# Altium footprint library IC.PcbLib: 108 footprints (part 5 of 8)
Each footprint in its own frame and in the unit in brackets; x right, y up, seen from the top. Pads: shape width x height; smd on the part's side, far side on the other; paste and mask are expansions set on the pad; w line width, h text height; cw(c..) or ccw(c..) is an arc to the next point about the centre after c.
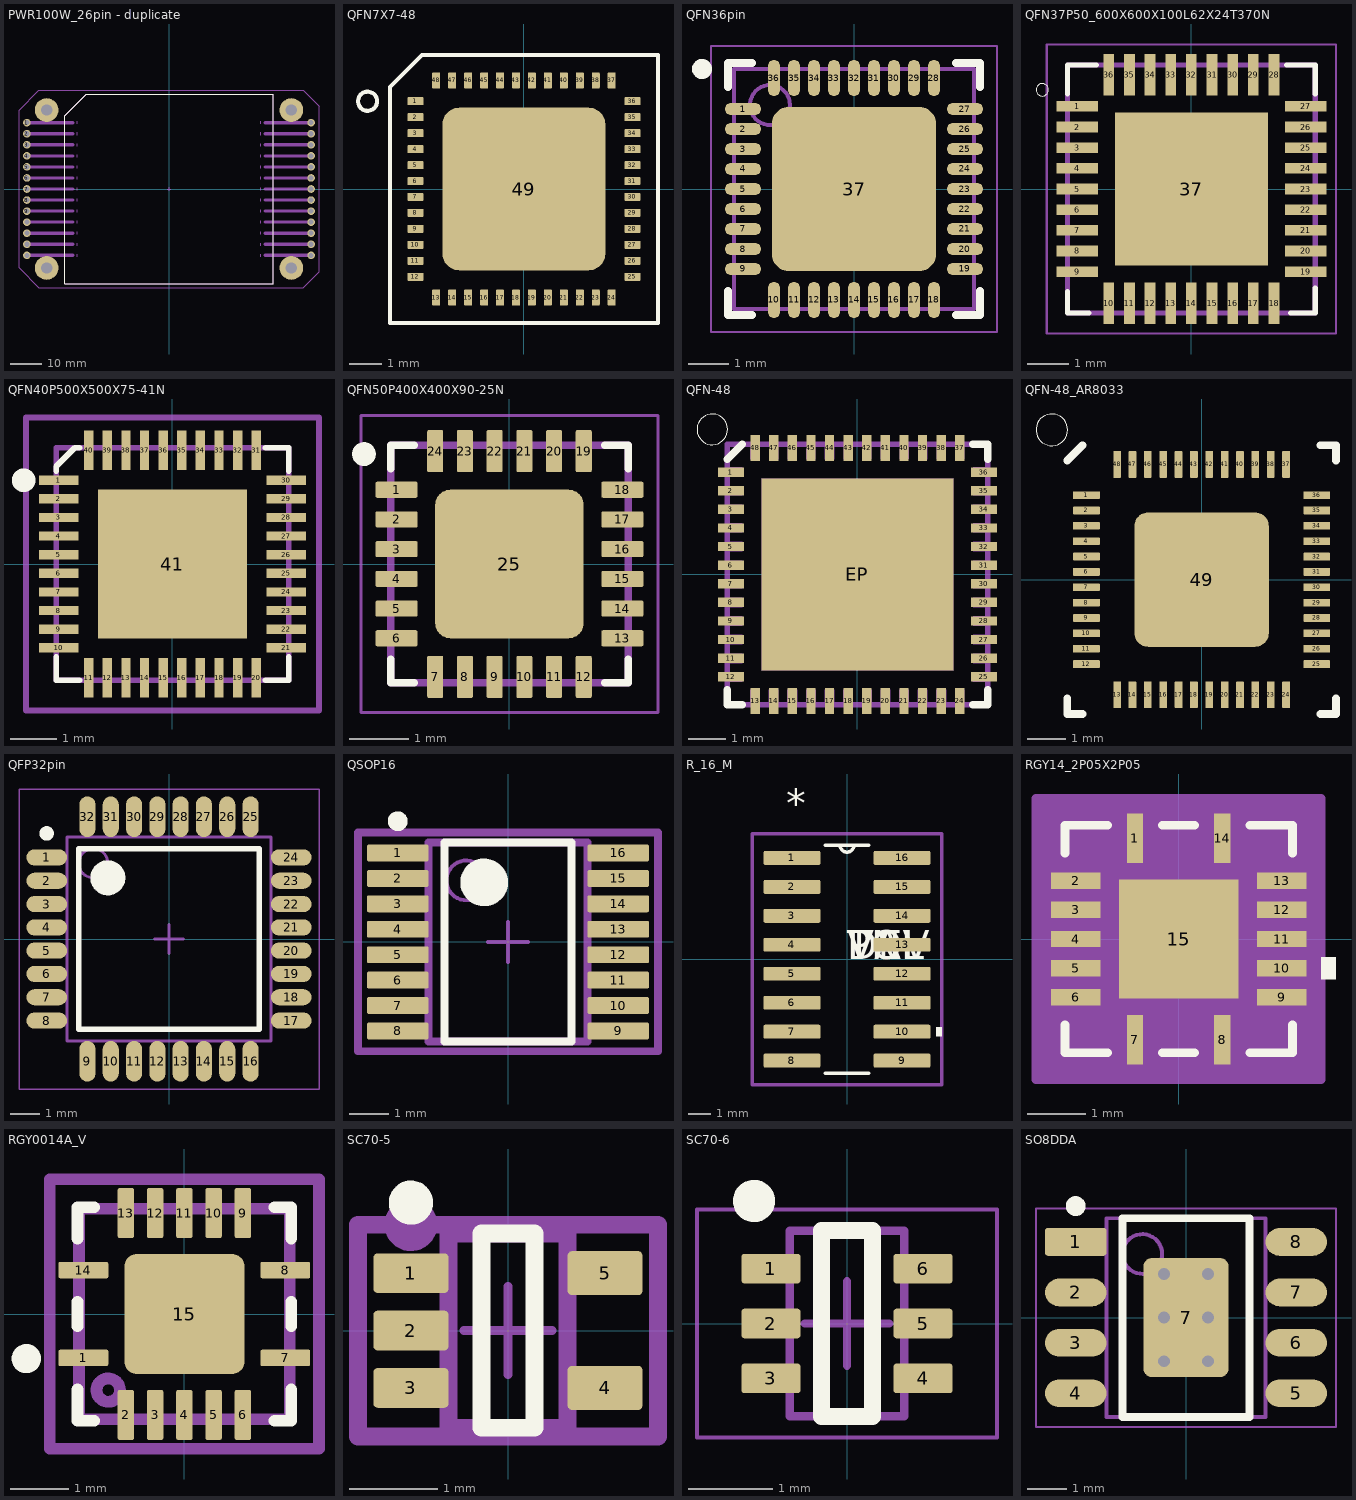
[diagram p4: the footprints below, top view; thin cyan lines are the x and y axes]

## PWR100W_26pin - duplicate [mm] "Modul CPU 26 PIN"
height 12.5
pads (30):
  round 2.4 hole 1.6: 1(-45,21.001) 2(-45,17.5) 3(-45,14.001) 4(-45,10.5) 5(-45,7.001) 6(-45,3.501) 7(-45,0) 8(-45,-3.499) 9(-45,-6.999) 10(-45,-10.5) 11(-45,-13.999) 12(-45,-17.499) 13(-45,-20.999) 14(45,-20.999) 15(45,-17.499) 16(45,-13.999) 17(45,-10.5) 18(45,-6.999) 19(45,-3.499) 20(45,0) 21(45,3.501) 22(45,7.001) 23(45,10.5) 24(45,14.001) 25(45,17.5) 26(45,21.001)
  round 7.5 hole 3.6: ""(-38.75,-25) ""(-38.75,25) ""(38.75,-25) ""(38.75,25)
Top Overlay:
  lines w0.2: -33,-30 -33,23.25 -26.25,30 33,30 33,-30 -33,-30
M3_comm_top:
  text ".comment" at -3,-0.5 h2
M5_asm_top:
  lines w0.2: -33,-30 -33,23.25 -26.25,30 33,30 33,-30 -33,-30
  lines w1: -45,-21 -30.5,-21 ; -45,-17.5 -30.5,-17.5 ; -45,-14 -30.5,-14 ; -45,-10.5 -30.5,-10.5 ; -45,-7 -30.5,-7 ; -45,-3.5 -30.5,-3.5 ; -45,-0.001 -30.5,-0.001 ; -45,3.5 -30.5,3.5 ; -45,7 -30.5,7 ; -45,10.5 -30.5,10.5 ; -45,14 -30.5,14 ; -45,17.5 -30.5,17.5 ; -45,21 -30.5,21 ; 30.5,-21 45,-21 ; 30.5,-17.5 45,-17.5 ; 30.5,-14 45,-14 ; 30.5,-10.5 45,-10.5 ; 30.5,-7 45,-7 ; 30.5,-3.5 45,-3.5 ; 30.5,-0.001 45,-0.001 ; 30.5,3.5 45,3.5 ; 30.5,7 45,7 ; 30.5,10.5 45,10.5 ; 30.5,14 45,14 ; 30.5,17.5 45,17.5 ; 30.5,21 45,21
  text "PIN #26" at 42.4,22.3 h2
  text "PIN #14" at 42.6,-23.6 h2
  text "PIN #13" at -47.4,-24 h2
  text "PIN #1" at -46.9,22.5 h2
  text ".Designator" at -2,5.5 h2
M7_courtyard_top:
  lines w0.1: -0.5,0 0.5,0 ; 0,-0.5 0,0.5
  lines w0.2: -47.5,-25 -47.5,25 -41.25,31.25 42.5,31.25 47.5,26.25 47.5,-26.25 42.5,-31.25 -41.25,-31.25 -47.5,-25
M9_board_outline:
  lines w0.2: -29,-21.406 -29,-20.606 ; -29,-17.906 -29,-17.106 ; -29,-14.406 -29,-13.606 ; -29,-10.906 -29,-10.106 ; -29,-7.406 -29,-6.606 ; -29,-3.906 -29,-3.106 ; -29,-0.406 -29,0.394 ; -29,3.094 -29,3.894 ; -29,6.594 -29,7.394 ; -29,10.094 -29,10.894 ; -29,13.594 -29,14.394 ; -29,17.094 -29,17.894 ; -29,20.594 -29,21.394 ; 29,-21.406 29,-20.606 ; 29,-17.906 29,-17.106 ; 29,-14.406 29,-13.606 ; 29,-10.906 29,-10.106 ; 29,-7.406 29,-6.606 ; 29,-3.906 29,-3.106 ; 29,-0.406 29,0.394 ; 29,3.094 29,3.894 ; 29,6.594 29,7.394 ; 29,10.094 29,10.894 ; 29,13.594 29,14.394 ; 29,17.094 29,17.894 ; 29,20.594 29,21.394
3D body "ИВЕП100В_СТЕП_формованные_вывода.STEP": height 13, standoff -2.39, extent -104.772,-106.5 -13.628,-46.5
3D body: height 6, standoff -2, extent 44.5,17.001 45.496,17.999
3D body: height 6.5, standoff 5.5, extent 44.509,17.002 45.5,17.998
3D body: height 6.5, standoff 5.5, extent 33,17.002 45,18
3D body: height 6.5, standoff 5.5, extent 33,10.002 45,11
3D body: height 6.5, standoff 5.5, extent 44.509,10.002 45.5,10.998
3D body: height 6, standoff -2, extent 44.5,10.001 45.496,10.999
3D body: height 6.5, standoff 5.5, extent 33,6.503 45,7.501
3D body: height 6.5, standoff 5.5, extent 44.508,6.503 45.5,7.499
3D body: height 6, standoff -2, extent 44.5,6.502 45.496,7.5
3D body: height 6.5, standoff 5.5, extent 33,-0.498 45,0.5
3D body: height 6.5, standoff 5.5, extent 44.508,-0.498 45.5,0.498
3D body: height 6, standoff -2, extent 44.5,-0.499 45.496,0.499
3D body: height 6.5, standoff 5.5, extent 33,-7.497 45,-6.499
3D body: height 6.5, standoff 5.5, extent 44.509,-7.497 45.5,-6.501
3D body: height 6, standoff -2, extent 44.5,-7.498 45.496,-6.5
3D body: height 6.5, standoff 5.5, extent 33,-10.998 45,-10
3D body: height 6.5, standoff 5.5, extent 44.509,-10.998 45.5,-10.002
3D body: height 6, standoff -2, extent 44.5,-10.999 45.496,-10.001
3D body: height 6, standoff -2, extent 44.5,-21.498 45.496,-20.5
3D body: height 6.5, standoff 5.5, extent 44.508,-21.497 45.5,-20.501
3D body: height 6.5, standoff 5.5, extent 33,-21.497 45,-20.499
3D body: height 6, standoff -2, extent 44.5,-17.998 45.496,-17
3D body: height 6.5, standoff 5.5, extent 44.508,-17.997 45.5,-17.001
3D body: height 6.5, standoff 5.5, extent 33,-17.997 45,-16.999
3D body: height 6.5, standoff 5.5, extent 33,-14.497 45,-13.499
3D body: height 6.5, standoff 5.5, extent 44.508,-14.497 45.5,-13.501
3D body: height 6, standoff -2, extent 44.5,-14.498 45.496,-13.5
3D body: height 6.5, standoff 5.5, extent 33,-3.997 45,-2.999
3D body: height 6.5, standoff 5.5, extent 44.508,-3.997 45.5,-3.001
3D body: height 6, standoff -2, extent 44.5,-3.998 45.496,-3
3D body: height 6.5, standoff 5.5, extent 33,3.003 45,4.001
3D body: height 6.5, standoff 5.5, extent 44.508,3.003 45.5,3.999
3D body: height 6, standoff -2, extent 44.5,3.002 45.496,4
3D body: height 6.5, standoff 5.5, extent 33,13.503 45,14.501
3D body: height 6.5, standoff 5.5, extent 44.508,13.503 45.5,14.499
3D body: height 6, standoff -2, extent 44.5,13.502 45.496,14.5
3D body: height 6.5, standoff 5.5, extent 33,20.503 45,21.501
3D body: height 6.5, standoff 5.5, extent 44.508,20.503 45.5,21.499
3D body: height 6, standoff -2, extent 44.5,20.502 45.496,21.5
3D body: height 6, standoff -2, extent -45.496,20.502 -44.5,21.5
3D body: height 6.5, standoff 5.5, extent -45.5,20.503 -44.508,21.499
3D body: height 6.5, standoff 5.5, extent -45,20.503 -33,21.501
3D body: height 6, standoff -2, extent -45.496,13.502 -44.5,14.5
3D body: height 6.5, standoff 5.5, extent -45.5,13.503 -44.508,14.499
3D body: height 6.5, standoff 5.5, extent -45,13.503 -33,14.501
3D body: height 6, standoff -2, extent -45.496,3.002 -44.5,4
3D body: height 6.5, standoff 5.5, extent -45.5,3.003 -44.508,3.999
3D body: height 6.5, standoff 5.5, extent -45,3.003 -33,4.001
3D body: height 6, standoff -2, extent -45.496,-3.998 -44.5,-3
3D body: height 6.5, standoff 5.5, extent -45.5,-3.997 -44.508,-3.001
3D body: height 6.5, standoff 5.5, extent -45,-3.997 -33,-2.999
3D body: height 6, standoff -2, extent -45.496,-14.498 -44.5,-13.5
3D body: height 6.5, standoff 5.5, extent -45.5,-14.497 -44.508,-13.501
3D body: height 6.5, standoff 5.5, extent -45,-14.497 -33,-13.499
3D body: height 6.5, standoff 5.5, extent -45,-17.997 -33,-16.999
3D body: height 6.5, standoff 5.5, extent -45.5,-17.997 -44.508,-17.001
3D body: height 6, standoff -2, extent -45.496,-17.998 -44.5,-17
3D body: height 6.5, standoff 5.5, extent -45,-21.497 -33,-20.499
3D body: height 6.5, standoff 5.5, extent -45.5,-21.497 -44.508,-20.501
3D body: height 6, standoff -2, extent -45.496,-21.498 -44.5,-20.5
3D body: height 6, standoff -2, extent -45.496,-10.999 -44.5,-10.001
3D body: height 6.5, standoff 5.5, extent -45.5,-10.998 -44.509,-10.002
3D body: height 6.5, standoff 5.5, extent -45,-10.998 -33,-10
3D body: height 6, standoff -2, extent -45.496,-7.498 -44.5,-6.5
3D body: height 6.5, standoff 5.5, extent -45.5,-7.497 -44.509,-6.501
3D body: height 6.5, standoff 5.5, extent -45,-7.497 -33,-6.499
3D body: height 6, standoff -2, extent -45.496,-0.499 -44.5,0.499
3D body: height 6.5, standoff 5.5, extent -45.5,-0.498 -44.508,0.498
3D body: height 6.5, standoff 5.5, extent -45,-0.498 -33,0.5
3D body: height 6, standoff -2, extent -45.496,6.502 -44.5,7.5
3D body: height 6.5, standoff 5.5, extent -45.5,6.503 -44.508,7.499
3D body: height 6.5, standoff 5.5, extent -45,6.503 -33,7.501
3D body: height 6, standoff -2, extent -45.496,10.001 -44.5,10.999
3D body: height 6.5, standoff 5.5, extent -45.5,10.002 -44.509,10.998
3D body: height 6.5, standoff 5.5, extent -45,10.002 -33,11
3D body: height 6.5, standoff 5.5, extent -45,17.002 -33,18
3D body: height 6.5, standoff 5.5, extent -45.5,17.002 -44.509,17.998
3D body: height 6, standoff -2, extent -45.496,17.001 -44.5,17.999
3D body "Корпус.stp": height 10, standoff 0, extent -42.5,-30 42.5,30
3D body "M3x0_5xL Phillips Panhead Screw.step": height 3.58, standoff -2.8, extent -41.55,22.2 -35.95,27.8
3D body "M3x0_5xL Phillips Panhead Screw.step": height 3.58, standoff -2.8, extent 35.95,22.2 41.55,27.8
3D body "M3x0_5xL Phillips Panhead Screw.step": height 3.58, standoff -2.8, extent 35.95,-27.8 41.55,-22.2
3D body "M3x0_5xL Phillips Panhead Screw.step": height 3.58, standoff -2.8, extent -41.55,-27.8 -35.95,-22.2

## QFN7X7-48 [mm] "KSZ9031RNX"
pads (49):
  rrect20% 0.5x0.25 smd: 1(-3.4,2.75) 2(-3.4,2.25) 3(-3.4,1.75) 4(-3.4,1.25) 5(-3.4,0.75) 6(-3.4,0.25) 7(-3.4,-0.25) 8(-3.4,-0.75) 9(-3.4,-1.25) 10(-3.4,-1.75) 11(-3.4,-2.25) 12(-3.4,-2.75) 25(3.4,-2.75) 26(3.4,-2.25) 27(3.4,-1.75) 28(3.4,-1.25) 29(3.4,-0.75) 30(3.4,-0.25) 31(3.4,0.25) 32(3.4,0.75) 33(3.4,1.25) 34(3.4,1.75) 35(3.4,2.25) 36(3.4,2.75)
  rrect20% 0.25x0.5 smd: 13(-2.75,-3.4) 14(-2.25,-3.4) 15(-1.75,-3.4) 16(-1.25,-3.4) 17(-0.75,-3.4) 18(-0.25,-3.4) 19(0.25,-3.4) 20(0.75,-3.4) 21(1.25,-3.4) 22(1.75,-3.4) 23(2.25,-3.4) 24(2.75,-3.4) 37(2.75,3.4) 38(2.25,3.4) 39(1.75,3.4) 40(1.25,3.4) 41(0.75,3.4) 42(0.25,3.4) 43(-0.25,3.4) 44(-0.75,3.4) 45(-1.25,3.4) 46(-1.75,3.4) 47(-2.25,3.4) 48(-2.75,3.4)
  rrect20% 5.1x5.1 smd: 49(0,0)
Top Overlay:
  circle w0.127: c-4.9,2.75 r0.3
  lines w0.127: -4.2,-4.2 -4.2,3.2 -3.2,4.2 4.2,4.2 4.2,-4.2 -4.2,-4.2
Top Paste:
  lines w0.025: -2.475,-1.025 -1.025,-1.025 -1.025,-2.475 ; -2.475,1.025 -1.025,1.025 -1.025,2.475 ; 1.025,-2.475 1.025,-1.025 2.475,-1.025 ; 1.025,2.475 1.025,1.025 2.475,1.025 ; -2.475,-0.725 -1.025,-0.725 -1.025,0.725 -2.475,0.725 -2.475,-0.725 ; -0.725,-2.475 0.725,-2.475 0.725,-1.025 -0.725,-1.025 -0.725,-2.475 ; -0.725,-0.725 0.725,-0.725 0.725,0.725 -0.725,0.725 -0.725,-0.725 ; -0.725,1.025 0.725,1.025 0.725,2.475 -0.725,2.475 -0.725,1.025 ; 1.025,-0.725 2.475,-0.725 2.475,0.725 1.025,0.725 1.025,-0.725

## QFN36pin [mm] "QFN, 36-Leads, IPC Medium Density"
height 1
pads (37):
  oval 0.9x0.3 smd: 1(-2.775,2) 2(-2.775,1.5) 3(-2.775,1) 4(-2.775,0.5) 5(-2.775,0) 6(-2.775,-0.5) 7(-2.775,-1) 8(-2.775,-1.5) 9(-2.775,-2) 19(2.775,-2) 20(2.775,-1.5) 21(2.775,-1) 22(2.775,-0.5) 23(2.775,0) 24(2.775,0.5) 25(2.775,1) 26(2.775,1.5) 27(2.775,2)
  oval 0.3x0.9 smd: 10(-2,-2.775) 11(-1.5,-2.775) 12(-1,-2.775) 13(-0.5,-2.775) 14(0,-2.775) 15(0.5,-2.775) 16(1,-2.775) 17(1.5,-2.775) 18(2,-2.775) 28(2,2.775) 29(1.5,2.775) 30(1,2.775) 31(0.5,2.775) 32(0,2.775) 33(-0.5,2.775) 34(-1,2.775) 35(-1.5,2.775) 36(-2,2.775)
  rrect20% 4.1x4.1 smd: 37(0,0)
Top Overlay:
  circle w0.25: c-3.8,3 r0.125
  lines w0.2: -3.15,-2.55 -3.15,-3.15 -2.55,-3.15 ; -3.15,2.55 -3.15,3.15 -2.55,3.15 ; 2.55,-3.15 3.15,-3.15 3.15,-2.55 ; 2.55,3.15 3.15,3.15 3.15,2.55
Mechanical 13:
  circle w0.1: c-2.1,2.1 r0.5
  lines w0.1: -3,-3 3,-3 3,3 -3,3 -3,-3
Mechanical 15:
  lines w0.05: -3.575,-3.575 3.575,-3.575 3.575,3.575 -3.575,3.575 -3.575,-3.575
  lines w0.1: -0.5,0 0.5,0 ; 0,-0.5 0,0.5
3D body "QFN36 (6x6).step": height 0.9, standoff 0.01, extent -3.103,-3.102 3.102,3.103

## QFN37P50_600X600X100L62X24T370N [mm]
pads (37):
  rect 1x0.26 smd: 1(-2.765,2) 2(-2.765,1.5) 3(-2.765,1) 4(-2.765,0.5) 5(-2.765,0) 6(-2.765,-0.5) 7(-2.765,-1) 8(-2.765,-1.5) 9(-2.765,-2) 19(2.765,-2) 20(2.765,-1.5) 21(2.765,-1) 22(2.765,-0.5) 23(2.765,0) 24(2.765,0.5) 25(2.765,1) 26(2.765,1.5) 27(2.765,2)
  rect 0.26x1 smd: 10(-2,-2.765) 11(-1.5,-2.765) 12(-1,-2.765) 13(-0.5,-2.765) 14(0,-2.765) 15(0.5,-2.765) 16(1,-2.765) 17(1.5,-2.765) 18(2,-2.765) 28(2,2.765) 29(1.5,2.765) 30(1,2.765) 31(0.5,2.765) 32(0,2.765) 33(-0.5,2.765) 34(-1,2.765) 35(-1.5,2.765) 36(-2,2.765)
  rect 3.7x3.7 smd: 37(0,0)
Top Overlay:
  circle w0: c-3.61,2.4 r0.15
  lines w0.127: -3,-2.48 -3,-3 -2.48,-3 ; -3,2.3 -3,3 -2.3,3 ; 2.3,3 3,3 3,2.3 ; 2.4,-3 3,-3 3,-2.4
Top Paste:
  region: 0.18,1.49 1.49,1.49 1.49,0.18 0.18,0.18
  region: -0.18,-1.496 -1.496,-1.496 -1.496,-0.18 -0.18,-0.18
  region: 1.494,-0.184 1.494,-1.493 0.177,-1.493 0.177,-0.184
  region: -1.492,0.178 -1.492,1.492 -0.182,1.492 -0.182,0.178
M1_3D_TOP:
  lines w0.05: -3.5,-3.5 3.5,-3.5 3.5,3.5 -3.5,3.5 -3.5,-3.5
  lines w0.127: -3,-3 3,-3 3,3 -3,3 -3,-3

## QFN40P500X500X75-41N [mm]
pads (41):
  rect 0.85x0.2 smd: 1(-2.45,1.8) 2(-2.45,1.4) 3(-2.45,1) 4(-2.45,0.6) 5(-2.45,0.2) 6(-2.45,-0.2) 7(-2.45,-0.6) 8(-2.45,-1) 9(-2.45,-1.4) 10(-2.45,-1.8) 21(2.45,-1.8) 22(2.45,-1.4) 23(2.45,-1) 24(2.45,-0.6) 25(2.45,-0.2) 26(2.45,0.2) 27(2.45,0.6) 28(2.45,1) 29(2.45,1.4) 30(2.45,1.8)
  rect 0.2x0.85 smd: 11(-1.8,-2.45) 12(-1.4,-2.45) 13(-1,-2.45) 14(-0.6,-2.45) 15(-0.2,-2.45) 16(0.2,-2.45) 17(0.6,-2.45) 18(1,-2.45) 19(1.4,-2.45) 20(1.8,-2.45) 31(1.8,2.45) 32(1.4,2.45) 33(1,2.45) 34(0.6,2.45) 35(0.2,2.45) 36(-0.2,2.45) 37(-0.6,2.45) 38(-1,2.45) 39(-1.4,2.45) 40(-1.8,2.45)
  rect 3.2x3.2 smd: 41(0,0)
Top Overlay:
  circle w0.305: c-3.2,1.8 r0.1
  lines w0.127: -2.5,-2 -2.5,-2.5 -2,-2.5 ; -2.5,2 -2.5,2.1 -2.1,2.5 -2,2.5 ; 2,-2.5 2.5,-2.5 2.5,-2 ; 2,2.5 2.5,2.5 2.5,2
M1_3D_TOP:
  lines w0.127: -3.15,-3.15 -3.15,3.15 3.15,3.15 3.15,-3.15 -3.15,-3.15 ; -2.5,-2.5 -2.5,2.5 2.5,2.5 2.5,-2.5 -2.5,-2.5

## QFN50P400X400X90-25N [mm] "KSZ8081RNACA-TR"
pads (25):
  rrect20% 0.71x0.27 smd: 1(-1.9,1.25) 2(-1.9,0.75) 3(-1.9,0.25) 4(-1.9,-0.25) 5(-1.9,-0.75) 6(-1.9,-1.25) 13(1.9,-1.25) 14(1.9,-0.75) 15(1.9,-0.25) 16(1.9,0.25) 17(1.9,0.75) 18(1.9,1.25)
  rrect20% 0.27x0.71 smd: 7(-1.25,-1.9) 8(-0.75,-1.9) 9(-0.25,-1.9) 10(0.25,-1.9) 11(0.75,-1.9) 12(1.25,-1.9) 19(1.25,1.9) 20(0.75,1.9) 21(0.25,1.9) 22(-0.25,1.9) 23(-0.75,1.9) 24(-1.25,1.9)
  rrect20% 2.5x2.5 smd: 25(0,0)
Top Overlay:
  circle w0.2: c-2.45,1.85 r0.1
  lines w0.127: -2,-1.6 -2,-2 -1.6,-2 ; -2,1.6 -2,2 -1.6,2 ; 1.6,-2 2,-2 2,-1.6 ; 1.6,2 2,2 2,1.6
Top Paste:
  region: -1.104,-0.1 -0.1,-0.1 -0.1,-1.104 -1.104,-1.104
  region: 0.1,-0.1 1.1,-0.1 1.1,-1.103 0.1,-1.103
  region: 0.1,1.1 1.1,1.1 1.1,0.1 0.1,0.1
  region: -1.103,1.1 -0.1,1.1 -0.1,0.1 -1.103,0.1
M1_3D_TOP:
  lines w0.05: -2.5,-2.5 2.5,-2.5 2.5,2.5 -2.5,2.5 -2.5,-2.5
  lines w0.127: -2,-2 2,-2 2,2 -2,2 -2,-2

## QFN-48 [mm]
pads (49):
  rect 0.7x0.25 smd: 1(-3.4,2.75) 2(-3.4,2.25) 3(-3.4,1.75) 4(-3.4,1.25) 5(-3.4,0.75) 6(-3.4,0.25) 7(-3.4,-0.25) 8(-3.4,-0.75) 9(-3.4,-1.25) 10(-3.4,-1.75) 11(-3.4,-2.25) 12(-3.4,-2.75) 25(3.4,-2.75) 26(3.4,-2.25) 27(3.4,-1.75) 28(3.4,-1.25) 29(3.4,-0.75) 30(3.4,-0.25) 31(3.4,0.25) 32(3.4,0.75) 33(3.4,1.25) 34(3.4,1.75) 35(3.4,2.25) 36(3.4,2.75)
  rect 0.25x0.7 smd: 13(-2.75,-3.4) 14(-2.25,-3.4) 15(-1.75,-3.4) 16(-1.25,-3.4) 17(-0.75,-3.4) 18(-0.25,-3.4) 19(0.25,-3.4) 20(0.75,-3.4) 21(1.25,-3.4) 22(1.75,-3.4) 23(2.25,-3.4) 24(2.75,-3.4) 37(2.75,3.4) 38(2.25,3.4) 39(1.75,3.4) 40(1.25,3.4) 41(0.75,3.4) 42(0.25,3.4) 43(-0.25,3.4) 44(-0.75,3.4) 45(-1.25,3.4) 46(-1.75,3.4) 47(-2.25,3.4) 48(-2.75,3.4)
  rect 5.15x5.15 smd: EP(0,0)
Top Overlay:
  circle w0: c-3.9,3.9 r0.412
  lines w0.203: -3.5,-3.1 -3.5,-3.5 -3.1,-3.5 ; -3.5,3.1 -3.1,3.5 ; 3.1,-3.5 3.5,-3.5 3.5,-3.1 ; 3.1,3.5 3.5,3.5 3.5,3.1
M1_3D_TOP:
  drawing of 53 lines, arcs and shapes, not listed

## QFN-48_AR8033 [mm] "AR8033 qfn48"
pads (49):
  rrect20% 0.7x0.2 smd: 1(-3,2.2) 2(-3,1.8) 3(-3,1.4) 4(-3,1) 5(-3,0.6) 6(-3,0.2) 7(-3,-0.2) 8(-3,-0.6) 9(-3,-1) 10(-3,-1.4) 11(-3,-1.8) 12(-3,-2.2) 25(3,-2.2) 26(3,-1.8) 27(3,-1.4) 28(3,-1) 29(3,-0.6) 30(3,-0.2) 31(3,0.2) 32(3,0.6) 33(3,1) 34(3,1.4) 35(3,1.8) 36(3,2.2)
  rrect20% 0.2x0.7 smd: 13(-2.2,-3) 14(-1.8,-3) 15(-1.4,-3) 16(-1,-3) 17(-0.6,-3) 18(-0.2,-3) 19(0.2,-3) 20(0.6,-3) 21(1,-3) 22(1.4,-3) 23(1.8,-3) 24(2.2,-3) 37(2.2,3) 38(1.8,3) 39(1.4,3) 40(1,3) 41(0.6,3) 42(0.2,3) 43(-0.2,3) 44(-0.6,3) 45(-1,3) 46(-1.4,3) 47(-1.8,3) 48(-2.2,3)
  rrect20% 3.5x3.5 smd: 49(0,0)
Top Overlay:
  circle w0: c-3.9,3.9 r0.412
  lines w0.203: -3.5,-3.1 -3.5,-3.5 -3.1,-3.5 ; -3.5,3.1 -3.1,3.5 ; 3.1,-3.5 3.5,-3.5 3.5,-3.1 ; 3.1,3.5 3.5,3.5 3.5,3.1

## QFP32pin [mm] "TQFP, 32pin, IPC Medium Density"
height 1.2
pads (32):
  oval 1.4x0.55 smd: 1(-4.2,2.8) 2(-4.2,2) 3(-4.2,1.2) 4(-4.2,0.4) 5(-4.2,-0.4) 6(-4.2,-1.2) 7(-4.2,-2) 8(-4.2,-2.8) 17(4.2,-2.8) 18(4.2,-2) 19(4.2,-1.2) 20(4.2,-0.4) 21(4.2,0.4) 22(4.2,1.2) 23(4.2,2) 24(4.2,2.8)
  oval 0.55x1.4 smd: 9(-2.8,-4.2) 10(-2,-4.2) 11(-1.2,-4.2) 12(-0.4,-4.2) 13(0.4,-4.2) 14(1.2,-4.2) 15(2,-4.2) 16(2.8,-4.2) 25(2.8,4.2) 26(2,4.2) 27(1.2,4.2) 28(0.4,4.2) 29(-0.4,4.2) 30(-1.2,4.2) 31(-2,4.2) 32(-2.8,4.2)
Top Overlay:
  circle w0.6: c-2.1,2.1 r0.3
  circle w0.25: c-4.2,3.625 r0.125
  lines w0.2: -3.1,-3.1 3.1,-3.1 3.1,3.1 -3.1,3.1 -3.1,-3.1
Mechanical 13:
  circle w0.1: c-2.6,2.6 r0.5
  lines w0.1: -3.5,-3.5 3.5,-3.5 3.5,3.5 -3.5,3.5 -3.5,-3.5
Mechanical 15:
  lines w0.05: -5.15,-5.15 5.15,-5.15 5.15,5.15 -5.15,5.15 -5.15,-5.15
  lines w0.1: -0.5,0 0.5,0 ; 0,-0.5 0,0.5
3D body "TQFP32-1.step": height 1.1, standoff 0, extent -4.509,-4.508 4.509,4.509

## QSOP16 [mm] "ADUM3190ARQZ"
height 1.75
pads (16):
  rrect20% 1.55x0.425 smd: 1(-2.775,2.24) 2(-2.775,1.6) 3(-2.775,0.96) 4(-2.775,0.32) 5(-2.775,-0.32) 6(-2.775,-0.96) 7(-2.775,-1.6) 8(-2.775,-2.24) 9(2.775,-2.24) 10(2.775,-1.6) 11(2.775,-0.96) 12(2.775,-0.32) 13(2.775,0.32) 14(2.775,0.96) 15(2.775,1.6) 16(2.775,2.24)
Top Overlay:
  circle w0.6: c-0.6,1.5 r0.3
  circle w0.25: c-2.775,3.04 r0.125
  lines w0.2: -1.6,-2.5 1.6,-2.5 1.6,2.5 -1.6,2.5 -1.6,-2.5
M3_comm_top:
  text ".comment" at -3,-0.5 h2
M5_asm_top:
  circle w0.1: c-1.05,1.55 r0.5
  lines w0.2: -2,-2.5 2,-2.5 2,2.5 -2,2.5 -2,-2.5
  text ".Designator" at -3.1,3.3 h2
M7_courtyard_top:
  lines w0.1: -0.5,0 0.5,0 -0.5,0 ; 0,-0.5 0,0.5 0,-0.5
  lines w0.2: -3.775,-2.75 3.775,-2.75 3.775,2.75 -3.775,2.75 -3.775,-2.75
3D body "QSOP16.step": height 1.75, standoff 0.01, extent -3.097,-2.5 3.097,2.5

## R_16_M [mil]
pads (16):
  rrect20% 98x24 smd: 1(-95,175) 2(-95,125) 3(-95,75) 4(-95,25) 5(-95,-25) 6(-95,-75) 7(-95,-125) 8(-95,-175) 9(95,-175) 10(95,-125) 11(95,-75) 12(95,-25) 13(95,25) 14(95,75) 15(95,125) 16(95,175)
Top Overlay:
  region: 154,-117.5 164,-117.5 164,-132.5 154,-132.5
  lines w6: -37.69,-197 37.69,-197 ; -37.69,197 37.69,197 ; -12,197 ccw(c0,197) 12,197
  text "TOL" at 0,0 h50
  text "VAL" at 0,0 h50
  text "DEV" at 0,0 h50
  text "PN" at 0,0 h50
  text "*" at -105,244 h50
Mechanical 13:
  lines w0: -12,197 ccw(c0,197) 12,197
  text "RefDes2" at 0,0 h50
  text "*" at -105,244 h50
Mechanical 15:
  lines w3.94: -164,-217 164,-217 164,-216.54 164,217 -164,217 -164,-217
  lines w6: -164,-217 164,-217 164,217 -164,217 -164,-217
3D body: height 10, standoff 0, extent 0,0 10,10
3D body "SOIC-16-2.step": height 68.9, standoff 0, extent -118.11,-196.85 118.11,196.85

## RGY14_2P05X2P05 [mm]
pads (15):
  rect 0.28x0.85 smd paste-0.412 mask+0: 1(-0.75,1.731) 7(-0.75,-1.731) 8(0.75,-1.731) 14(0.75,1.731)
  rect 0.85x0.28 smd paste-0.412 mask+0: 2(-1.769,1) 3(-1.769,0.5) 4(-1.769,0) 5(-1.769,-0.5) 6(-1.769,-1) 9(1.769,-1) 10(1.769,-0.5) 11(1.769,0) 12(1.769,0.5) 13(1.769,1)
  rect 2.05x2.05 smd paste-1.012 mask-1.016: 15(0,0)
Top Overlay:
  region: 2.448,-0.309 2.702,-0.309 2.702,-0.69 2.448,-0.69
  lines w0.152: -1.952,-1.473 -1.952,-1.952 -1.223,-1.952 ; -1.952,1.473 -1.952,1.952 -1.223,1.952 ; -0.277,-1.952 0.277,-1.952 ; -0.277,1.952 0.277,1.952 ; 1.223,-1.952 1.952,-1.952 1.952,-1.473 ; 1.223,1.952 1.952,1.952 1.952,1.473
Top Paste:
  drawing of 27 lines, arcs and shapes, not listed
Top Solder:
  region: 0.594,-1.088 0.594,1.088 1.088,1.088 1.088,-1.088
  region: 0.194,-1.088 0.194,1.088 -0.194,1.088 -0.194,-1.088
  region: -1.088,-1.088 -1.088,1.088 -0.594,1.088 -0.594,-1.088
  region: -1.088,-1.088 -1.088,-0.594 1.088,-0.594 1.088,-1.088
  region: -1.088,-0.194 -1.088,0.194 1.088,0.194 1.088,-0.194
  region: -1.088,0.594 -1.088,1.088 1.088,1.088 1.088,0.594
  region: 0,-1.025
  region: 0,-1.025
  region: 0,1.025
  region: 0,1.025
  region: -0.54,2.226 -0.96,2.226 -0.96,1.236 -0.54,1.236
  region: 0.96,2.226 0.54,2.226 0.54,1.236 0.96,1.236
  region: 2.264,1.21 1.274,1.21 1.274,0.79 2.264,0.79
  region: 2.264,0.71 1.274,0.71 1.274,0.29 2.264,0.29
  region: 2.264,0.21 1.274,0.21 1.274,-0.21 2.264,-0.21
  region: 2.264,-0.29 1.274,-0.29 1.274,-0.71 2.264,-0.71
  region: 2.264,-0.79 1.274,-0.79 1.274,-1.21 2.264,-1.21
  region: 0.96,-1.236 0.54,-1.236 0.54,-2.226 0.96,-2.226
  region: -0.54,-1.236 -0.96,-1.236 -0.96,-2.226 -0.54,-2.226
  region: -1.274,-0.79 -2.264,-0.79 -2.264,-1.21 -1.274,-1.21
  region: -1.274,-0.29 -2.264,-0.29 -2.264,-0.71 -1.274,-0.71
  region: -1.274,0.21 -2.264,0.21 -2.264,-0.21 -1.274,-0.21
  region: -1.274,0.71 -2.264,0.71 -2.264,0.29 -1.274,0.29
  region: -1.274,1.21 -2.264,1.21 -2.264,0.79 -1.274,0.79
Mechanical 13:
  lines w0.025: -1.825,0.555 -0.555,1.825 ; -1.825,-1.825 -1.825,1.825 1.825,1.825 1.825,-1.825 -1.825,-1.825
Mechanical 15:
  region: 2.448,-2.41 -2.448,-2.41 -2.448,2.41 2.448,2.41
  lines w0.152: -2.448,-2.41 2.448,-2.41 2.448,2.41 -2.448,2.41 -2.448,-2.41
Mechanical 16:
  circle w0.127: c0.394,0.394 r0.191
  circle w0.127: c0.394,-0.394 r0.191
  circle w0.127: c-0.394,0.394 r0.191
  circle w0.127: c-0.394,-0.394 r0.191

## RGY0014A_V [mm] "QFN, 14-Leads, Body 3.5x3.5mm, Thermal Pad 2.05x2.05mm, TI Recommend"
height 1
pads (15):
  rrect20% 0.85x0.28 smd paste-0.85 mask+0.07: 1(-1.725,-0.75) 7(1.725,-0.75) 8(1.725,0.75) 14(-1.725,0.75)
  rrect20% 0.28x0.85 smd paste-0.85 mask+0.07: 2(-1,-1.725) 3(-0.5,-1.725) 4(0,-1.725) 5(0.5,-1.725) 6(1,-1.725) 9(1,1.725) 10(0.5,1.725) 11(0,1.725) 12(-0.5,1.725) 13(-1,1.725)
  rrect20% 2.05x2.05 smd paste-2.05 mask+0.07: 15(0,0)
Top Overlay:
  circle w0.25: c-2.7,-0.762 r0.125
  lines w0.2: -1.825,-1.29 -1.825,-1.825 -1.54,-1.825 ; -1.825,-0.21 -1.825,0.21 ; -1.825,1.29 -1.825,1.825 -1.54,1.825 ; 1.54,-1.825 1.825,-1.825 1.825,-1.29 ; 1.54,1.825 1.825,1.825 1.825,1.29 ; 1.825,-0.21 1.825,0.21
Top Paste:
  rectangle: -1.115,-2.125 -0.885,-1.325
  rectangle: -0.615,-2.125 -0.385,-1.325
  rectangle: 0.885,-2.125 1.115,-1.325
  rectangle: -0.115,-2.125 0.115,-1.325
  rectangle: 0.385,-2.125 0.615,-1.325
  rectangle: 0.385,1.325 0.615,2.125
  rectangle: -0.115,1.325 0.115,2.125
  rectangle: 0.885,1.325 1.115,2.125
  rectangle: -0.615,1.325 -0.385,2.125
  rectangle: -1.115,1.325 -0.885,2.125
  rectangle: 0.15,0.15 0.97,0.97
  region: 2.125,-0.865 2.125,-0.635 1.325,-0.635 1.325,-0.865
  region: 2.125,0.635 2.125,0.865 1.325,0.865 1.325,0.635
  region: -2.125,0.865 -2.125,0.635 -1.325,0.635 -1.325,0.865
  region: -2.125,-0.635 -2.125,-0.865 -1.325,-0.865 -1.325,-0.635
  region: -0.15,0.97 -0.97,0.97 -0.97,0.15 -0.15,0.15
  region: -0.15,-0.15 -0.97,-0.15 -0.97,-0.97 -0.15,-0.97
  rectangle: 0.15,-0.97 0.97,-0.15
M3_comm_top:
  text ".comment" at -3,-0.5 h2
M5_asm_top:
  circle w0.2: c-1.3,-1.3 r0.2
  lines w0.2: -1.8,-1.8 1.8,-1.8 1.8,1.8 -1.8,1.8 -1.8,-1.8
  text ".Designator" at -3.3,2.3 h2
M7_courtyard_top:
  lines w0.1: -0.5,0 0.5,0 ; 0,-0.5 0,0.5
  lines w0.2: -2.3,-2.3 -2.3,2.3 2.3,2.3 2.3,-2.3 -2.3,-2.3
Mechanical 13:
  lines w0.1: -1.75,-1.75 1.75,-1.75 1.75,1.75 -1.75,1.75 -1.75,-1.75
Mechanical 15:
  lines w0.05: -2.25,-2.25 2.25,-2.25 2.25,2.25 -2.25,2.25 -2.25,-2.25
  lines w0.1: -0.5,0 0.5,0 ; 0,-0.5 0,0.5
3D body "SN74AHC04RGYR.step": height 1.01, standoff 0, extent -1.825,-1.825 1.825,1.825

## SC70-5 [mm] "SC70, IPC Medium Density"
height 1.1
pads (5):
  rrect20% 0.85x0.45 smd: 1(-1.1,0.65) 2(-1.1,0) 3(-1.1,-0.65)
  rrect20% 0.85x0.5 smd: 4(1.1,-0.65) 5(1.1,0.65)
Top Overlay:
  circle w0.25: c-1.1,1.45 r0.125
  lines w0.2: -0.3,-1.1 0.3,-1.1 0.3,1.1 -0.3,1.1 -0.3,-1.1
M3_comm_top:
  text ".comment" at -3,-0.5 h2
M5_asm_top:
  circle w0.2: c-1.1,1.2 r0.2
  lines w0.2: -0.675,-1.1 0.675,-1.1 0.675,1.1 -0.675,1.1 -0.675,-1.1
  text ".Designator" at -3.3,1.8 h2
M7_courtyard_top:
  lines w0.1: -0.5,0 0.5,0 ; 0,-0.5 0,0.5
  lines w0.2: -1.7,-1.2 1.7,-1.2 1.7,1.2 -1.7,1.2 -1.7,-1.2
3D body "sot353.step": height 1, standoff 0, extent -1.15,-1.05 1.15,1.05

## SC70-6 [mm] "SC70, IPC Medium Density"
height 1.1
pads (6):
  rrect20% 0.7x0.35 smd: 1(-0.9,0.65) 2(-0.9,0) 3(-0.9,-0.65) 4(0.9,-0.65) 5(0.9,0) 6(0.9,0.65)
Top Overlay:
  circle w0.25: c-1.1,1.45 r0.125
  lines w0.2: -0.3,-1.1 0.3,-1.1 0.3,1.1 -0.3,1.1 -0.3,-1.1
Mechanical 13:
  lines w0.1: -0.675,-1.1 -0.675,1.1 0.675,1.1 0.675,-1.1 -0.675,-1.1
Mechanical 15:
  lines w0.05: -1.775,-1.35 -1.775,1.35 1.775,1.35 1.775,-1.35 -1.775,-1.35
  lines w0.1: -0.5,0 0.5,0 ; 0,-0.5 0,0.5
3D body "User Library-SC70-6.step": height 0.92, standoff -0.03, extent -1.05,-1 1.05,1

## SO8DDA [mm] "SOIC, DDA, IPC Medium Density"
height 1.7
pads (9):
  rrect20% 1.55x0.7 smd: 1(-2.775,1.905)
  oval 1.55x0.7 smd: 2(-2.775,0.635) 3(-2.775,-0.635) 4(-2.775,-1.905) 5(2.775,-1.905) 6(2.775,-0.635) 7(2.775,0.635) 8(2.775,1.905)
  rrect20% 2.15x3 smd: 7(0,0)
via -0.55,1.1 diameter 0.7 hole 0.3
via 0.55,1.1 diameter 0.7 hole 0.3
via -0.55,0 diameter 0.7 hole 0.3
via 0.55,0 diameter 0.7 hole 0.3
via -0.55,-1.1 diameter 0.7 hole 0.3
via 0.55,-1.1 diameter 0.7 hole 0.3
Top Overlay:
  circle w0.25: c-2.775,2.805 r0.125
  lines w0.2: -1.6,-2.5 -1.6,2.5 1.6,2.5 1.6,-2.5 -1.6,-2.5
Mechanical 13:
  circle w0.1: c-1.1,1.6 r0.5
  lines w0.1: -2,-2.5 -2,2.5 2,2.5 2,-2.5 -2,-2.5
Mechanical 15:
  lines w0.05: -3.775,-2.75 -3.775,2.75 3.775,2.75 3.775,-2.75 -3.775,-2.75
  lines w0.1: -0.5,0 0.5,0 ; 0,-0.5 0,0.5
3D body "SO8DDA.step": height 1.7, standoff 0, extent -3.1,-2.5 3.1,2.5